# Altium footprint library Connectors.PcbLib: 66 footprints (part 2 of 5)
Each footprint in its own frame and in the unit in brackets; x right, y up, seen from the top. Pads: shape width x height; smd on the part's side, far side on the other; paste and mask are expansions set on the pad; w line width, h text height; cw(c..) or ccw(c..) is an arc to the next point about the centre after c.
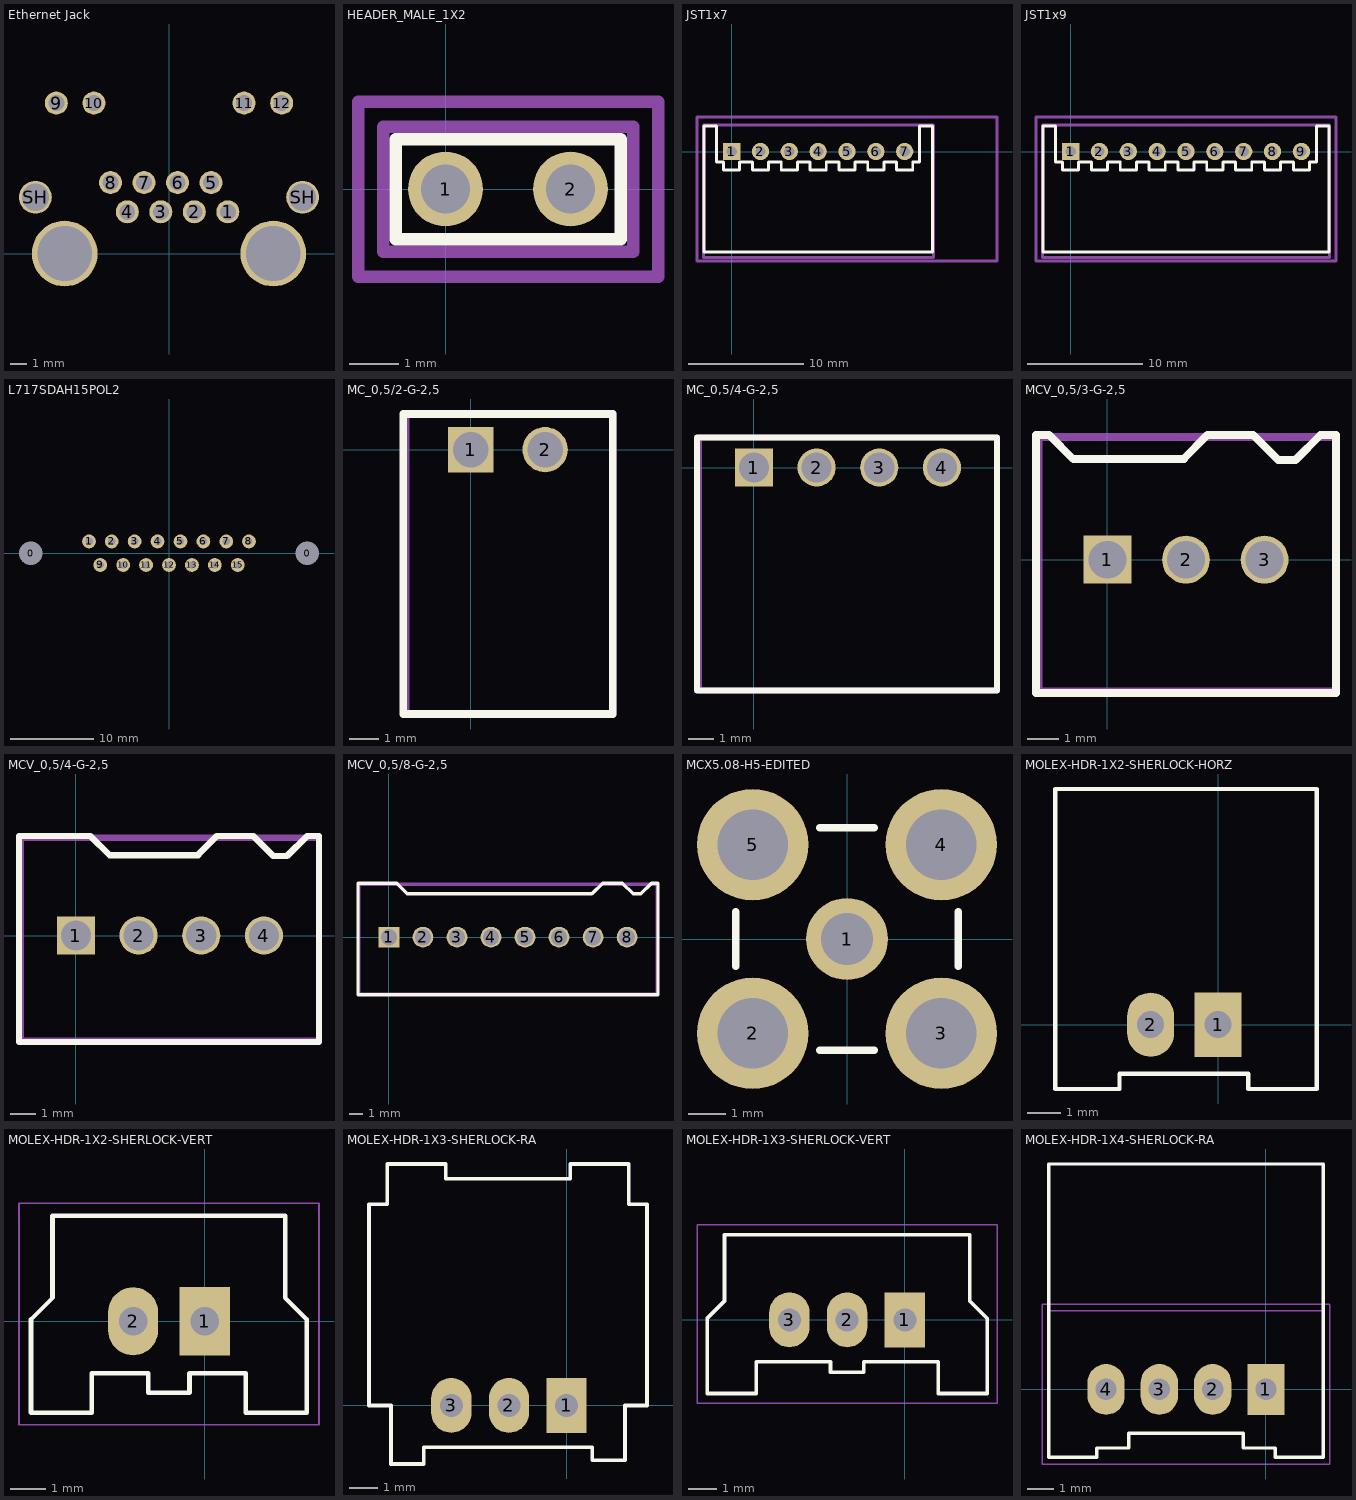
[diagram p1: the footprints below, top view; thin cyan lines are the x and y axes]

## Ethernet Jack [mm] "CONN MOD JACK 8P8C R/A SHIELDED"
height 13.97
pads (16):
  round 1.4 hole 0.97: 1(3.58,2.54) 2(1.54,2.54) 3(-0.5,2.54) 4(-2.54,2.54) 5(2.56,4.32) 6(0.52,4.32) 7(-1.52,4.32) 8(-3.56,4.32) 9(-6.86,9.16) 10(-4.57,9.16) 11(4.57,9.16) 12(6.86,9.16)
  round 2 hole 1.65: SH(-8.13,3.43) SH(8.13,3.43)
  round 4 hole 3.33: ""(-6.35,0) ""(6.35,0)
3D body "c-6116075-04-a-3d.stp": height 13.03, standoff -4.5, extent -8.323,-6.276 8.314,10.437

## HEADER_MALE_1X2 [mil]
pads (2):
  round 60 hole 39.37: 1(0,0) 2(100,0)
Top Overlay:
  lines w10: -40,-40 -40,40 140,40 140,-40 -40,-40
Mechanical 13:
  lines w10: -50,-50 150,-50 150,50 -50,50 -50,-50
Mechanical 15:
  lines w10: -70,-70 170,-70 170,70 -70,70 -70,-70

## JST1x7 [mm]
height 6.1
pads (7):
  rect 1.5x1.5 hole 0.9: 1(0,0)
  round 1.5 hole 0.9: 2(2.5,0) 3(5,0) 4(7.5,0) 5(10,0) 6(12.5,0) 7(15,0)
Top Overlay:
  lines w0.254: 17.4,2.2 16.3,2.2 16.3,-0.9 15.7,-0.9 15.7,-1.6 14.3,-1.6 14.3,-0.9 13.2,-0.9 13.2,-1.6 11.8,-1.6 11.8,-0.9 10.7,-0.9 10.7,-1.6 9.3,-1.6 9.3,-0.9 8.2,-0.9 8.2,-1.6 6.8,-1.6 6.8,-0.9 5.7,-0.9 5.7,-1.6 4.3,-1.6 4.3,-0.9 3.2,-0.9 3.2,-1.6 1.8,-1.6 1.8,-0.9 0.7,-0.9 0.7,-1.6 -0.7,-1.6 -0.7,-0.9 -1.3,-0.9 -1.3,2.2 -2.4,2.2 -2.4,-8.7 17.425,-8.7 17.425,2.2
Mechanical 13:
  lines w0.254: -2.45,-9.2 -2.45,2.3 17.5,2.3 17.5,-9.2 -2.45,-9.2
Mechanical 15:
  lines w0.254: -3,-9.5 -3,3 23,3 23,-9.5 -3,-9.5
3D body "S9B-XH-A.STEP": height 6.17, standoff -3.37, extent -2.45,-9.2 22.45,2.3
3D body "S7B-XH-A.STEP": height 6.17, standoff -3.37, extent -2.45,-9.15 17.45,2.35

## JST1x9 [mm]
height 9.8
pads (9):
  rect 1.5x1.5 hole 0.9: 1(0,0)
  round 1.5 hole 0.9: 2(2.5,0) 3(5,0) 4(7.5,0) 5(10,0) 6(12.5,0) 7(15,0) 8(17.5,0) 9(20,0)
Top Overlay:
  lines w0.254: -2.4,-8.7 22.4,-8.7 22.4,2.2 21.3,2.2 21.3,-0.9 20.7,-0.9 20.7,-1.6 19.3,-1.6 19.3,-0.9 18.2,-0.9 18.2,-1.6 16.8,-1.6 16.8,-0.9 15.7,-0.9 15.7,-1.6 14.3,-1.6 14.3,-0.9 13.2,-0.9 13.2,-1.6 11.8,-1.6 11.8,-0.9 10.7,-0.9 10.7,-1.6 9.3,-1.6 9.3,-0.9 8.2,-0.9 8.2,-1.6 6.8,-1.6 6.8,-0.9 5.7,-0.9 5.7,-1.6 4.3,-1.6 4.3,-0.9 3.2,-0.9 3.2,-1.6 1.8,-1.6 1.8,-0.9 0.7,-0.9 0.7,-1.6 -0.7,-1.6 -0.7,-0.9 -1.3,-0.9 -1.3,2.2 -2.4,2.2 -2.4,-8.7
Mechanical 13:
  lines w0.254: -2.45,-9.2 22.45,-9.2 22.45,2.3 -2.45,2.3 -2.45,-9.2
Mechanical 15:
  lines w0.254: -3,-9.5 23,-9.5 23,3 -3,3 -3,-9.5
3D body "S9B-XH-A.STEP": height 6.17, standoff -3.37, extent -2.45,-9.2 22.45,2.3
3D body "S9B-XH-A.STEP": height 6.17, standoff -3.37, extent -2.45,-9.225 22.45,2.275

## L717SDAH15POL2 [mm] "CONN D-SUB PLUG 15POS VERT SLDR"
height 11
pads (17):
  round 1.524 hole 2.84: 0(-16.65,0) 0(16.65,0)
  round 1.662 hole 0.9: 1(-9.63,1.42) 2(-6.9,1.42) 3(-4.14,1.42) 4(-1.38,1.42) 5(1.38,1.42) 6(4.14,1.42) 7(6.9,1.42) 8(9.63,1.42) 9(-8.28,-1.42) 10(-5.52,-1.42) 11(-2.76,-1.42) 12(0,-1.42) 13(2.76,-1.42) 14(5.52,-1.42) 15(8.28,-1.42)
Top Layer:
  pour cut-out: 3.886,-4.851
3D body "L717SDAH15POL2.stp": height 11.69, standoff -5.01, extent -19.6,-6.274 19.6,6.276

## MC_0,5/2-G-2,5 [mil] "CONN TERM BLOCK 2.50MM 2POS RIGHT ANGLE"
pads (2):
  rect 60x60 hole 47.24: 1(0,0)
  round 60 hole 47.24: 2(98.43,0)
Top Overlay:
  lines w10: -89.57,-350.39 -89.57,47.24 187.99,47.24 187.99,-350.39 -89.57,-350.39
Mechanical 13:
  lines w10: -86.61,-350.39 -86.61,47.24 187.99,47.24 187.99,-350.39 -86.61,-350.39
Mechanical 15:
  lines w10: -86.61,-350.39 187.99,-350.39 187.99,47.24 -86.61,47.24 -86.61,-350.39
3D body "1881448_00.stp": height 318.9, standoff -137.8, extent -87,-349.82 184.65,47.82

## MC_0,5/4-G-2,5 [mil] "CONN TERM BLOCK 2.50MM 4POS RIGHT ANGLE"
pads (4):
  rect 60x60 hole 47.24: 1(0,0)
  round 60 hole 47.24: 2(98.43,0) 3(196.85,0) 4(295.27,0)
Top Overlay:
  lines w10: -89.57,-350.39 -89.57,47.24 381.89,47.24 381.89,-350.39 -89.57,-350.39
Mechanical 13:
  lines w10: -86.61,-350.39 -86.61,47.24 381.89,47.24 381.89,-350.39 -86.61,-350.39
Mechanical 15:
  lines w10: -86.61,-350.39 381.89,-350.39 381.89,47.24 -86.61,47.24 -86.61,-350.39
3D body "1881464.stp": height 137.8, standoff -318.9, extent -87.25,-349.64 381.25,48

## MCV_0,5/3-G-2,5 [mil] "CONN TERM BLOCK 2.50MM 3POS"
pads (3):
  rect 60x60 hole 47.24: 1(0,0)
  round 60 hole 47.24: 2(98.43,0) 3(196.85,0)
Top Overlay:
  lines w10: 94.94,125.98 125.46,156.5 182.54,156.5 214.04,125 235.69,125 267.19,156.5 285.89,156.5 ; 95.93,125.98 -42.85,125.98 -73.36,156.5 -89.57,156.5 -89.57,-167.32 286.42,-167.32 286.42,156.5
Mechanical 13:
  lines w10: -86.61,-165.35 -86.61,153.54 286.42,153.54 286.42,-165.35 -86.61,-165.35
Mechanical 15:
  lines w10: 286.42,-165.35 -86.61,-165.35 -86.61,153.54 286.42,153.54 ; 286.42,-164.37 286.42,154.53
3D body "1881561.stp": height 397.64, standoff -137.8, extent -87.04,-165 283.04,153.9

## MCV_0,5/4-G-2,5 [mil] "CONN TERM BLOCK 2.50MM 4POS"
pads (4):
  rect 60x60 hole 47.24: 1(0,0)
  round 60 hole 47.24: 2(98.43,0) 3(196.85,0) 4(295.28,0)
Top Overlay:
  lines w10: 190.94,125.98 221.46,156.5 278.54,156.5 310.04,125 331.69,125 363.19,156.5 381.89,156.5 381.89,-167.32 -89.57,-167.32 -89.57,156.5 22.64,156.5 53.15,125.98 191.93,125.98
Mechanical 13:
  lines w10: -86.61,-165.35 381.89,-165.35 381.89,153.54 -86.61,153.54 -86.61,-165.35
Mechanical 15:
  lines w10: 381.89,-165.35 -86.61,-165.35 -86.61,153.54 381.89,153.54 ; 381.89,-164.37 381.89,154.53
3D body "1881574.stp": height 397.64, standoff -137.8, extent -86.61,-165.35 381.89,153.54

## MCV_0,5/8-G-2,5 [mil] "CONN TERM BLOCK 2.50MM 8POS"
pads (8):
  rect 60x60 hole 47.24: 1(0,0)
  round 60 hole 47.24: 2(98.43,0) 3(196.85,0) 4(295.28,0) 5(393.7,0) 6(492.13,0) 7(590.55,0) 8(688.98,0)
Top Overlay:
  lines w10: -89.57,-167.32 -89.57,156.5 22.64,156.5 53.15,125.98 587.6,125.98 618.11,156.5 675.2,156.5 706.69,125 728.35,125 759.84,156.5 778.54,156.5 778.54,-167.32 -89.57,-167.32
Mechanical 13:
  lines w10: -86.61,-165.35 -86.61,153.54 775.59,153.54 775.59,-165.35 -86.61,-165.35
Mechanical 15:
  lines w10: -86.61,-165.35 775.59,-165.35 775.59,153.54 -86.61,153.54 -86.61,-165.35
3D body "1881613.stp": height 397.64, standoff -137.8, extent -86.61,-165.35 775.59,153.54

## MCX5.08-H5-EDITED [mm] "Connector; RF Coaxial, MCX, Thru-Hole; 5 Position; Edited for hole size 0.2mm larger"
height 5.85
pads (5):
  round 2.2 hole 1.4: 1(0,0)
  round 3 hole 1.9: 2(-2.54,-2.54) 3(2.54,-2.54) 4(2.54,2.54) 5(-2.54,2.54)
Top Overlay:
  lines w0.2: -3,-0.74 -3,0.74 ; -0.74,-3 0.74,-3 ; -0.74,3 0.74,3 ; 3,-0.74 3,0.74

## MOLEX-HDR-1X2-SHERLOCK-HORZ [mm]
height 8.5
pads (2):
  rect 1.397x1.905 hole 0.8: 1(0,0)
  oval 1.397x1.905 hole 0.8: 2(-2,0)
Top Overlay:
  lines w0.127: -4.826,-1.905 -2.921,-1.905 -2.921,-1.45 -1.575,-1.45 -0.425,-1.45 0.889,-1.45 0.889,-1.905 2.921,-1.905 2.921,-0.021 2.921,6.985 -4.826,6.985 -4.826,0.074 -4.826,-1.905
3D body "353630260.stp": height 5.54, standoff -3.16, extent -4.826,-1.905 2.874,8.595

## MOLEX-HDR-1X2-SHERLOCK-VERT [mm]
height 8.5
pads (2):
  rect 1.397x1.905 hole 0.8: 1(0,0)
  oval 1.397x1.905 hole 0.8: 2(-2,0)
Top Overlay:
  lines w0.127: -4.85,-2.55 -4.85,0.05 -4.25,0.65 -4.25,2.95 2.25,2.95 2.25,0.65 2.85,0.05 2.85,-2.55 1.15,-2.55 1.15,-1.45 -0.425,-1.45 -0.425,-1.99 -1.575,-1.99 -1.575,-1.45 -3.15,-1.45 -3.15,-2.55 -4.85,-2.55
Mechanical 13:
  lines w0.05: -4.85,-2.55 -3.15,-2.55 -3.15,-1.45 -1.575,-1.45 -1.575,-1.99 -0.425,-1.99 -0.425,-1.45 1.15,-1.45 1.15,-2.55 2.85,-2.55 2.85,0.05 2.25,0.65 2.25,2.95 -4.25,2.95 -4.25,0.65 -4.85,0.05 -4.85,-2.55
Mechanical 15:
  lines w0.05: -5.185,-2.89 3.19,-2.89 3.19,3.295 -5.185,3.295 -5.185,-2.89
3D body "molex-sherlock-2v-353620250.stp": height 8.5, standoff -3.3, extent -4.866,-2.591 2.834,2.959

## MOLEX-HDR-1X3-SHERLOCK-RA [mm]
height 8.5
pads (3):
  rect 1.397x1.905 hole 0.8: 1(0,0)
  oval 1.397x1.905 hole 0.8: 2(-2,0) 3(-4,0)
Top Overlay:
  lines w0.127: -6.858,0 -6.096,0 -6.096,-2.032 -4.953,-2.032 -4.953,-1.45 -2.575,-1.45 -1.425,-1.45 0.889,-1.45 0.889,-1.905 2.032,-1.905 2.032,0 2.794,0 2.794,6.985 2.159,6.985 2.159,8.382 0.127,8.382 0.127,7.874 -4.191,7.874 -4.191,8.382 -6.223,8.382 -6.223,6.985 -6.858,6.985 -6.858,0
3D body "353630360.stp": height 5.75, standoff -2.95, extent -6.882,-1.991 2.818,8.509

## MOLEX-HDR-1X3-SHERLOCK-VERT [mm]
height 8.5
pads (3):
  rect 1.397x1.905 hole 0.8: 1(0,0)
  oval 1.397x1.905 hole 0.8: 2(-2,0) 3(-4,0)
Top Overlay:
  lines w0.127: -6.85,-2.55 -5.15,-2.55 -5.15,-1.45 -2.575,-1.45 -2.575,-1.82 -1.425,-1.82 -1.425,-1.45 1.15,-1.45 1.15,-2.55 2.85,-2.55 2.85,0.05 2.25,0.65 2.25,2.95 -6.25,2.95 -6.25,0.65 -6.85,0.05 -6.85,-2.55
Mechanical 13:
  lines w0.05: -6.85,-2.55 -6.85,0.05 -6.25,0.65 -6.25,2.95 2.25,2.95 2.25,0.65 2.85,0.05 2.85,-2.55 1.15,-2.55 1.15,-1.45 -1.425,-1.45 -1.425,-1.82 -2.575,-1.82 -2.575,-1.45 -5.15,-1.45 -5.15,-2.55 -6.85,-2.55
Mechanical 15:
  lines w0.05: -7.2,-2.89 3.19,-2.89 3.19,3.295 -7.2,3.295 -7.2,-2.89
3D body "353620350.stp": height 8.57, standoff -3.23, extent -6.882,-2.565 2.818,2.985

## MOLEX-HDR-1X4-SHERLOCK-RA [mm]
height 8.5
pads (4):
  rect 1.397x1.905 hole 0.8: 1(0,0)
  oval 1.397x1.905 hole 0.8: 2(-2,0) 3(-4,0) 4(-6,0)
Top Overlay:
  lines w0.127: -8.15,-2.55 -6.35,-2.55 -6.35,-2.2 -5.15,-2.2 -5.15,-1.65 -0.85,-1.65 -0.85,-2.2 0.35,-2.2 0.35,-2.55 2.15,-2.55 2.15,2.95 2.15,8.449 2.141,8.458 -8.147,8.458 -8.15,8.455 -8.15,2.95 -8.15,-2.55
Mechanical 13:
  lines w0.05: -8.15,-2.55 -8.15,2.95 2.15,2.95 2.15,-2.55 0.35,-2.55 0.35,-2.2 -0.85,-2.2 -0.85,-1.65 -5.15,-1.65 -5.15,-2.2 -6.35,-2.2 -6.35,-2.55 -8.15,-2.55
Mechanical 15:
  lines w0.05: -8.4,-2.8 -8.4,3.2 2.4,3.2 2.4,-2.8 -8.4,-2.8
3D body "353630460.stp": height 5.54, standoff -3.16, extent -8.173,-1.981 2.127,8.519